# Altium integrated library 00Lib.IntLib: 286 symbols (part 1 of 2)
Pins are listed as number, name and electrical type; pins without a type are passive.

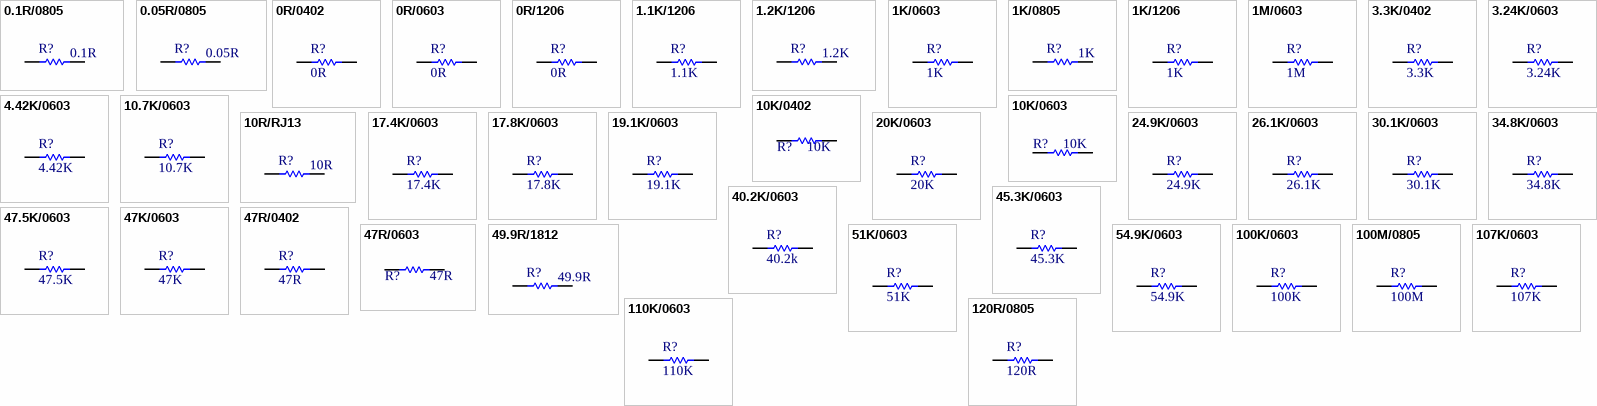
[diagram p0: symbols 0.1R/0805 to 120R/0805]

## 0.1R/0805
designator R?, comment 0.1R
阻值（欧姆） 0.1Ω / 精度 ±1% / 功率 1/3W / 温度系数 ±100ppm/°C; Manufacturer: UNI-ROYAL(厚声); A_Manufacturer: 718; Code: HP05W3F100LT5E; CompType: Resistor; A_ComType: RM型片式膜固定电阻器; DistributorCode: C270842; Package: 0805; A_Code: -
footprint S0805R
pins: 1, 2

## 0.05R/0805
designator R?, comment 0.05R
阻值（欧姆） 0.05Ω / 精度 ±1% / 功率 1/4W / 温度系数 ±400ppm/°C; Manufacturer: UNI-ROYAL(厚声); A_Manufacturer: 718; Code: CS05W4F500MT5E; CompType: Resistor; A_ComType: RM型片式膜固定电阻器; DistributorCode: C270863; Package: 0805; A_Code: -
footprint S0805R
pins: 1, 2

## 0R/0402
designator R?, comment 0R
精度 ±1% / 功率 1/16W C / 阻值 0Ω; Manufacturer: FH(风华); A_Manufacturer: 718; Code: RC-02000FT; A_Code: J-RM1005(0402)-K-B-0R-F; CompType: Resistor; A_ComType: RM型片式膜固定电阻器; DistributorCode: C140225; Package: 0402
footprint S0402R
pins: 1, 2

## 0R/0603
designator R?, comment 0R
精度 ±1% / 阻值 0Ω / 功率 0.1W; Manufacturer: FH(风华); A_Manufacturer: 718; Code: RS-03000FT; A_Code: J-RM1608(0603)-K-B-0R-F; CompType: Resistor; A_ComType: RM型片式膜固定电阻器; DistributorCode: C136582; Package: 0603
footprint S0603R (Footprint not found)
pins: 1, 2

## 0R/1206
designator R?, comment 0R
功率 0.25W / 精度 ±1% / 温度系数 ±100ppm/℃ / 阻值 1.1kΩ; Manufacturer: FH(风华); A_Manufacturer: 718; Code: RS-06000FT; A_Code: J-RM3216(1206)-K-B-0R-F; CompType: Resistor; A_ComType: RM型片式膜固定电阻器; DistributorCode: C140060; Package: 1206
footprint S0603R (Footprint not found)
footprint S1206R (1206 from SM-752 data)
pins: 1, 2

## 1.1K/1206
designator R?, comment 1.1K
功率 0.25W / 精度 ±1% / 温度系数 ±100ppm/℃ / 阻值 1.1kΩ; Manufacturer: FH(风华); A_Manufacturer: 718; Code: RS-06K1101FT; A_Code: J-RM3216(1206)-K-B-1.1K-F; CompType: Resistor; A_ComType: RM型片式膜固定电阻器; DistributorCode: C322820; Package: 1206
footprint S0603R (Footprint not found)
footprint S1206R (1206 from SM-752 data)
pins: 1, 2

## 1.2K/1206
designator R?, comment 1.2K
功率 0.25W / 精度 ±1% / 温度系数 ±100ppm/℃; Manufacturer: FH(风华); A_Manufacturer: 718; Code: RS-06K1201FT; A_Code: J-RM3216(1206)-K-B-1.2K-F; CompType: Resistor; A_ComType: RM型片式膜固定电阻器; DistributorCode: C88612; Package: 1206
footprint S0603R (Footprint not found)
footprint S1206R (1206 from SM-752 data)
pins: 1, 2

## 1K/0603
designator R?, comment 1K
精度 ±1% / 温度系数 ±100ppm/℃ / 阻值 1kΩ / 功率 0.1W; Manufacturer: FH(风华); A_Manufacturer: 718; Code: RS-03K1001FT; A_Code: J-RM1608(0603)-K-B-1K-F; CompType: Resistor; A_ComType: RM型片式膜固定电阻器; DistributorCode: C115325; Package: 0603
footprint S0603R
pins: 1, 2

## 1K/0805
designator R?, comment 1K
精度 ±1% / 温度系数 ±100ppm/℃ / 阻值 1kΩ / 功率 0.125W; Manufacturer: FH(风华); A_Manufacturer: 718; Code: RS-05K1001FT; A_Code: J-RM2012(0805)-K-B-1K-F; CompType: Resistor; A_ComType: RM型片式膜固定电阻器; DistributorCode: C115316; Package: 0805
footprint S0805R
pins: 1, 2

## 1K/1206
designator R?, comment 1K
功率 0.25W / 精度 ±1% / 温度系数 ±100ppm/℃ / 阻值 1kΩ; Manufacturer: FH(风华); A_Manufacturer: 718; Code: RS-06K1001FT; A_Code: J-RM3216(1206)-K-B-1K-F; CompType: Resistor; A_ComType: RM型片式膜固定电阻器; DistributorCode: C167634; Package: 1206
footprint S1206R (1206 from SM-752 data)
pins: 1, 2

## 1M/0603
designator R?, comment 1M
阻值 1MΩ / 精度 ±1% / 温度系数 ±100ppm/℃ / 功率 0.1W /; Manufacturer: FH(风华); A_Manufacturer: 718; Code: RS-03K1004FT; A_Code: J-RM1608(0603)-K-B-1M-F; CompType: Resistor; A_ComType: RM型片式膜固定电阻器; DistributorCode: C136593; Package: 0603
footprint S0603R
pins: 1, 2

## 3.3K/0402
designator R?, comment 3.3K
阻值 3.3kΩ / 精度 ±1% / 温度系数 ±200ppm/℃ / 功率 1/16W; Manufacturer: FH(风华); A_Manufacturer: 718; Code: RC-02W3301FT; A_Code: J-RM1005(0402)-K-B-3.3K-F; CompType: Resistor; A_ComType: RM型片式膜固定电阻器; DistributorCode: C310224; Package: 0402
footprint S0402R
pins: 1, 2

## 3.24K/0603
designator R?, comment 3.24K
精度 ±1% / 阻值 3.24kΩ / 温度系数 ±100ppm/℃ / 功率 0.1W; Manufacturer: FH(风华); A_Manufacturer: 718; Code: RS-03K3241FT; A_Code: J-RM1608(0603)-K-B-3.24K-F; CompType: Resistor; A_ComType: RM型片式膜固定电阻器; DistributorCode: C140102; Package: 0603
footprint S0603R
pins: 1, 2

## 4.42K/0603
designator R?, comment 4.42K
精度 ±1% / 阻值 4.42kΩ / 温度系数 ±100ppm/℃ / 功率 0.1W; Manufacturer: FH(风华); A_Manufacturer: 718; Code: RS-03K4421FT; A_Code: J-RM1608(0603)-K-B-4.42K-F; CompType: Resistor; A_ComType: RM型片式膜固定电阻器; DistributorCode: C321913; Package: 0603
footprint S0603R
pins: 1, 2

## 10.7K/0603
designator R?, comment 10.7K
精度 ±1% / 温度系数 ±100ppm/℃ / 阻值 10.7kΩ / 功率 0.1W; Manufacturer: FH(风华); A_Manufacturer: 718; Code: RS-03K1072FT; A_Code: J-RM1608(0603)-K-B-10.7K-F; CompType: Resistor; DistributorCode: C321678; Package: 0603
footprint S0603R (Footprint not found)
pins: 1, 2

## 10K/0402
designator R?, comment 10K
精度 ±1% / 温度系数 ±200ppm/℃ / 功率 1/16W / 阻值 10kΩ; Manufacturer: FH(风华); A_Manufacturer: 718; Code: RC-02W1002FT; A_Code: J-RM1005(0402)-K-B-10K-F; CompType: Resistor; A_ComType: RM型片式膜固定电阻器; DistributorCode: C258091; Package: 0402
footprint S0402R
pins: 1, 2

## 10K/0603
designator R?, comment 10K
精度 ±1% / 温度系数 ±100ppm/℃ / 阻值 10kΩ / 功率 0.1W; Manufacturer: FH(风华); A_Manufacturer: 718; Code: RS-03K1002FT; A_Code: J-RM1608(0603)-K-B-10K-F; CompType: Resistor; A_ComType: RM型片式膜固定电阻器; DistributorCode: C115324; Package: 0603
footprint S0603R
pins: 1, 2

## 10R/RJ13
designator R?, comment 10R
精度 ±1% / 温度系数 ±100ppm/℃ / 阻值 10Ω / 功率 0.167W; Manufacturer: 718; A_Code: J-RJ13-0.25W-10Ω-±1%-±100×10-6/K - SJ/T10775-2000; CompType: Resistor; A_ComType: RJ13型金属膜固定电阻器; Code: -; DistributorCode: -; Package: RJ13; A_Manufacturer: 718
footprint Axial-RJ13-1
pins: 1, 2

## 17.4K/0603
designator R?, comment 17.4K
精度 ±1% / 温度系数 ±100ppm/℃ / 阻值 17.4kΩ / 功率 0.1W; Manufacturer: FH(风华); A_Manufacturer: 718; Code: RS-03K1742FT; A_Code: J-RM1608(0603)-K-B-17.4K-F; CompType: Resistor; DistributorCode: C304711; Package: 0603
footprint S0603R (Footprint not found)
pins: 1, 2

## 17.8K/0603
designator R?, comment 17.8K
精度 ±1% / 温度系数 ±100ppm/℃ / 功率 0.1W; Manufacturer: FH(风华); A_Manufacturer: 718; Code: RS-03K1782FT; A_Code: J-RM1608(0603)-K-B-17.8K-F; CompType: Resistor; DistributorCode: C310271; Package: 0603
footprint S0603R (Footprint not found)
pins: 1, 2

## 19.1K/0603
designator R?, comment 19.1K
精度 ±1% / 阻值 19.1kΩ / 温度系数 ±100ppm/℃ / 功率 0.1W; Manufacturer: FH(风华); A_Manufacturer: 718; Code: RS-03K1912FT; A_Code: J-RM1608(0603)-K-B-19.1K-F; A_ComType: RM型片式膜固定电阻器; CompType: Resistor; DistributorCode: C321770; Package: 0603
footprint S0603R (Footprint not found)
pins: 1, 2

## 20K/0603
designator R?, comment 20K
精度 ±1% / 温度系数 ±100ppm/℃ / 阻值 20kΩ / 功率 0.1W; Manufacturer: FH(风华); A_Manufacturer: 718; Code: RS-03K2002FT; A_Code: J-RM1608(0603)-K-B-20K-F; CompType: Resistor; A_ComType: RM型片式膜固定电阻器; DistributorCode: C136589; Package: 0603
footprint S0603R (Footprint not found)
pins: 1, 2

## 24.9K/0603
designator R?, comment 24.9K
精度 ±1% / 温度系数 ±100ppm/℃ / 阻值 24.9kΩ / 功率 0.1W; Manufacturer: FH(风华); A_Manufacturer: 718; Code: RS-03K2492FT; A_Code: J-RM1608(0603)-K-B-24.9K-F; CompType: Resistor; DistributorCode: C321809; Package: 0603
footprint S0603R (Footprint not found)
pins: 1, 2

## 26.1K/0603
designator R?, comment 26.1K
精度 ±1% / 温度系数 ±100ppm/℃ / 功率 0.1W / 阻值 26.1kΩ; Manufacturer: FH(风华); A_Manufacturer: 718; Code: RS-03K2612FT; A_Code: J-RM1608(0603)-K-B-26.1K-F; CompType: Resistor; DistributorCode: C321818; Package: 0603
footprint S0603R (Footprint not found)
pins: 1, 2

## 30.1K/0603
designator R?, comment 30.1K
精度 ±1% / 温度系数 ±100ppm/℃ / 阻值 30.1kΩ / 功率 0.1W; Manufacturer: FH(风华); A_Manufacturer: 718; Code: RS-03K3012FT; A_Code: J-RM1608(0603)-K-B-30.1K-F; CompType: Resistor; A_ComType: RM型片式膜固定电阻器; DistributorCode: C321843; Package: 0603
footprint S0603R (Footprint not found)
pins: 1, 2

## 34.8K/0603
designator R?, comment 34.8K
精度 ±1% / 阻值 34.8kΩ / 温度系数 ±100ppm/℃ / 功率 0.1W; Manufacturer: FH(风华); A_Manufacturer: 718; Code: RS-03K3482FT; A_Code: J-RM1608(0603)-K-B-34.8K-F; CompType: Resistor; DistributorCode: C321868; Package: 0603
footprint S0603R (Footprint not found)
pins: 1, 2

## 40.2K/0603
designator R?, comment 40.2k
精度 ±1% / 阻值 40.2kΩ / 温度系数 ±100ppm/℃ / 功率 0.1W; Manufacturer: FH(风华); A_Manufacturer: 718; Code: RS-03K4022FT; A_Code: J-RM1608(0603)-K-B-40.2K-F; CompType: Resistor; A_ComType: RM型片式膜固定电阻器; DistributorCode: C286588; Package: 0603
footprint S0603R (Footprint not found)
pins: 1, 2

## 45.3K/0603
designator R?, comment 45.3K
精度 ±1% / 温度系数 ±100ppm/℃ / 功率 0.1W /; Manufacturer: FH(风华); A_Manufacturer: 718; Code: RS-03K4532FT; A_Code: J-RM1608(0603)-K-B-45.3K-F; CompType: Resistor; DistributorCode: C304756; Package: 0603
footprint S0603R (Footprint not found)
pins: 1, 2

## 47.5K/0603
designator R?, comment 47.5K
精度 ±1% / 阻值 47.5kΩ / 温度系数 ±100ppm/℃ / 功率 0.1W; Manufacturer: FH(风华); A_Manufacturer: 718; Code: RS-03K4752FT; A_Code: J-RM1608(0603)-K-B-47.5K-F; CompType: Resistor; A_ComType: RM型片式膜固定电阻器; DistributorCode: C321924; Package: 0603
footprint S0603R (Footprint not found)
pins: 1, 2

## 47K/0603
designator R?, comment 47K
阻值 47kΩ / 精度 ±1% / 温度系数 ±100ppm/℃ / 功率 0.1W /; Manufacturer: FH(风华); A_Manufacturer: 718; Code: RS-03K4702FT; A_Code: J-RM1608(0603)-K-B-47K-F; CompType: Resistor; A_ComType: RM型片式膜固定电阻器; DistributorCode: C136590; Package: 0603
footprint S0603R (Footprint not found)
pins: 1, 2

## 47R/0402
designator R?, comment 47R
功率 1/16W / 精度 ±1% / 温度系数 ±200ppm/℃ / 阻值 47Ω; Manufacturer: FH(风华); A_Manufacturer: 718; Code: RC-02W47R0FT; A_Code: J-RM1005(0402)-K-B-47R-F; CompType: Resistor; A_ComType: RM型片式膜固定电阻器; DistributorCode: C304619; Package: 0402
footprint S0402R1
pins: 1, 2

## 47R/0603
designator R?, comment 47R
精度 ±1% / 温度系数 ±100ppm/℃ / 阻值 47Ω / 功率 0.1W; Manufacturer: FH(风华); A_Manufacturer: 718; Code: RS-03K47R0FT; A_Code: J-RM1608(0603)-K-B-47R-F; CompType: Resistor; A_ComType: RM型片式膜固定电阻器; DistributorCode: C140087; Package: 0603
footprint S0603R (Footprint not found)
pins: 1, 2

## 49.9R/1812
designator R?, comment 49.9R
精度 ±1% / 功率 0.75W / 温度系数 ±100ppm/℃ / 阻值 49.9Ω; Manufacturer: UNI-ROYAL(厚声); A_Manufacturer: 718; Code: 181207F499JT4E; CompType: Resistor; A_ComType: RM型片式膜固定电阻器; DistributorCode: C422079; Package: 0805; A_Code: -
footprint R1812 (Chip Resistor, Body 180x120mil (4.5x3.2mm))
pins: 1, 2

## 51K/0603
designator R?, comment 51K
阻值 51kΩ / 精度 ±1% / 温度系数 ±100ppm/℃ / 功率 0.1W; Manufacturer: FH(风华); A_Manufacturer: 718; Code: RS-03K5102FT; A_Code: J-RM1608(0603)-K-B-51K-F; CompType: Resistor; A_ComType: RM型片式膜固定电阻器; DistributorCode: C95329; Package: 0603
footprint S0603R
pins: 1, 2

## 54.9K/0603
designator R?, comment 54.9K
精度 ±1% / 温度系数 ±100ppm/℃ / 功率 0.1W; Manufacturer: FH(风华); A_Manufacturer: 718; Code: RS-03K5492FT; A_Code: J-RM1608(0603)-K-B-54.9K-F; CompType: Resistor; A_ComType: RM型片式膜固定电阻器; DistributorCode: C321944; Package: 0603
footprint S0603R
pins: 1, 2

## 100K/0603
designator R?, comment 100K
精度 ±1% / 阻值 100kΩ / 温度系数 ±100ppm/℃ / 功率 0.1W; Manufacturer: FH(风华); A_Manufacturer: 718; Code: RS-03K1003FT; A_Code: J-RM1608(0603)-K-B-100K-F; CompType: Resistor; A_ComType: RM型片式膜固定电阻器; DistributorCode: C115320; Package: 0603
footprint S0603R
pins: 1, 2

## 100M/0805
designator R?, comment 100M
精度 ±1% / 温度系数 ±100ppm/℃ / 功率 0.125W; Manufacturer: UNI-ROYAL(厚声); A_Manufacturer: 718; Code: 0805W8F1006T5E; A_Code: J-RM2012(0805)-K-B-100M-F; CompType: Resistor; DistributorCode: C169373; Package: 0805
footprint S0805R
pins: 1, 2

## 107K/0603
designator R?, comment 107K
精度 ±1% / 温度系数 ±100ppm/℃ / 功率 0.1W; Manufacturer: FH(风华); A_Manufacturer: 718; Code: RS-03K1073FT; A_Code: J-RM1608(0603)-K-B-107K-F; CompType: Resistor; A_ComType: RM型片式膜固定电阻器; DistributorCode: C321679; Package: 0603
footprint S0603R (Footprint not found)
pins: 1, 2

## 110K/0603
designator R?, comment 110K
精度 ±1% / 温度系数 ±100ppm/℃ / 功率 0.1W / 阻值 110kΩ; Manufacturer: FH(风华); A_Manufacturer: 718; Code: RS-03K1103FT; A_Code: J-RM1608(0603)-K-B-110K-F; CompType: Resistor; A_ComType: RM型片式膜固定电阻器; DistributorCode: C304689; Package: 0603
footprint S0603R (Footprint not found)
pins: 1, 2

## 120R/0805
designator R?, comment 120R
精度 ±1% / 温度系数 ±100ppm/℃ / 阻值 120Ω / 功率 0.125W; Manufacturer: FH(风华); A_Manufacturer: 718; Code: RS-05K1200FT; A_Code: J-RM2012(0805)-K-B-120R-F; CompType: Resistor; A_ComType: RM型片式膜固定电阻器; DistributorCode: C139926; Package: 0805
footprint S0805R
pins: 1, 2

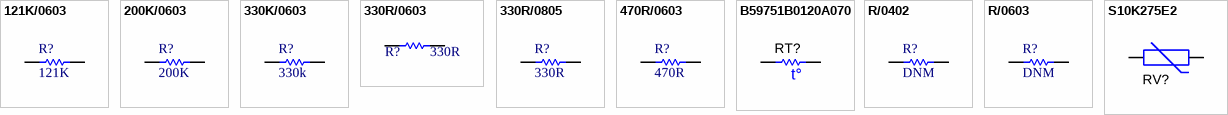
[diagram p1: symbols 121K/0603 to S10K275E2]

## 121K/0603
designator R?, comment 121K
精度 ±1% / 阻值 121kΩ / 温度系数 ±100ppm/℃ / 功率 0.1W; Manufacturer: FH(风华); A_Manufacturer: 718; Code: RS-03K1213FT; A_Code: J-RM1608(0603)-K-B-121K-F; CompType: Resistor; DistributorCode: C321700; Package: 0603
footprint S0603R (Footprint not found)
pins: 1, 2

## 200K/0603
designator R?, comment 200K
精度 ±1% / 温度系数 ±100ppm/℃ / 功率 0.1W / 阻值 200kΩ; Manufacturer: FH(风华); A_Manufacturer: 718; Code: RS-03K2003FT; A_Code: J-RM1608(0603)-K-B-200K-F; CompType: Resistor; DistributorCode: C95331; Package: 0603
footprint S0603R (Footprint not found)
pins: 1, 2

## 330K/0603
designator R?, comment 330k
精度 ±1% / 温度系数 ±100ppm/℃ / 功率 0.1W; Manufacturer: FH(风华); A_Manufacturer: 718; Code: RS-03K3303FT; A_Code: J-RM1608(0603)-K-B-330K-F; CompType: Resistor; DistributorCode: C286584; Package: 0603
footprint S0603R (Footprint not found)
pins: 1, 2

## 330R/0603
designator R?, comment 330R
精度 ±1% / 温度系数 ±100ppm/℃ / 阻值 330Ω / 功率 0.1W; Manufacturer: FH(风华); A_Manufacturer: 718; Code: RS-03K3300FT; A_Code: J-RM1608(0603)-K-B-330R-F; CompType: Resistor; A_ComType: RM型片式膜固定电阻器; DistributorCode: C125768; Package: 0603
footprint S0603R (Footprint not found)
pins: 1, 2

## 330R/0805
designator R?, comment 330R
精度 ±1% / 温度系数 ±100ppm/℃ / 功率 0.125W; Manufacturer: FH(风华); A_Manufacturer: 718; A_Code: J-RM2012(0805)-K-B-330R-F; CompType: Resistor; A_ComType: RM型片式膜固定电阻器; Code: RS-05K3300FT; DistributorCode: C154442; Package: 0805
footprint S0805R
pins: 1, 2

## 470R/0603
designator R?, comment 470R
精度 ±1% / 温度系数 ±100ppm/℃ / 功率 0.1W; Manufacturer: FH(风华); A_Manufacturer: 718; Code: RS-03K4700FT; A_Code: J-RM1608(0603)-K-B-470R-F; CompType: Resistor; A_ComType: RM型片式膜固定电阻器; DistributorCode: C116694; Package: 0603
footprint S0603R (Footprint not found)
pins: 1, 2

## B59751B0120A070
designator RT?, comment B59751C0120A070  (value not drawn)
Thermistor NTC, 50 ohm, 25%, D13xH18mm; Manufacturer: TDK; Value: 50; Tolerance_%: 25; TaMin_C: -40; TaMax_C: 125; U/M: EA; CompType: ThermistorNTC; SymbolVersion: 2008-11-25; PartNumber: B59751C0120A070; Series: B597; PackageReference: D13xH18mm; MountType: TH; RoHS: Y; ComponentLink1Description: Datasheet link; ComponentLink1URL: https://www.tdk-electronics.tdk.com/inf/55/db/PTC/PTC_ICL_OC_Leaded_260V_1000V.pdf; Published: 2009-09-22; Publisher: Texas Instruments; LatestRevisionDate: 2015-09-01; Supplier 1: Digi-Key; Supplier Part Number 1: 495-7219-ND; Supplier 2: Mouser; Supplier Part Number 2: 871-B59751C0120A070; Supplier 3: Farnell; Supplier Part Number 3: 2112820
footprint TDK_B751
pins: 1, 2
text: t°

## R/0402
designator R?, comment DNM
Manufacturer: FH(风华); A_Manufacturer: 718; CompType: Resistor; A_ComType: RM型片式膜固定电阻器; Code: -; DistributorCode: -; Package: 0402; A_Code: -
footprint S0402R
pins: 1, 2

## R/0603
designator R?, comment DNM
Manufacturer: FH(风华); A_Manufacturer: 718; CompType: Resistor; A_ComType: RM型片式膜固定电阻器; Code: -; DistributorCode: -; Package: 0603; A_Code: -
footprint S0603R
pins: 1, 2

## S10K275E2
designator RV?  (value not drawn)
Varistor 275V RMS 10MM Radial, TH; Manufacturer: EPCOS Inc; SymbolCreator: a0412235; SymbolVersion: 2012-06-04; PartNumber: S10K275E2; MountType: TH; ComponentLink1Description: Datasheet URL; ComponentLink1URL: http://www.epcos.com/inf/70/db/var_08/SIOV_Leaded_AdvanceD.pdf; RoHS: Y; PackageReference: 10mm Radial; Publisher: Texas Instruments; LatestRevisionDate: 2013-02-24; Supplier 1: Digi-Key; Supplier Part Number 1: 495-1433-ND
footprint VAR_S10K275E2
pins: 1, 2


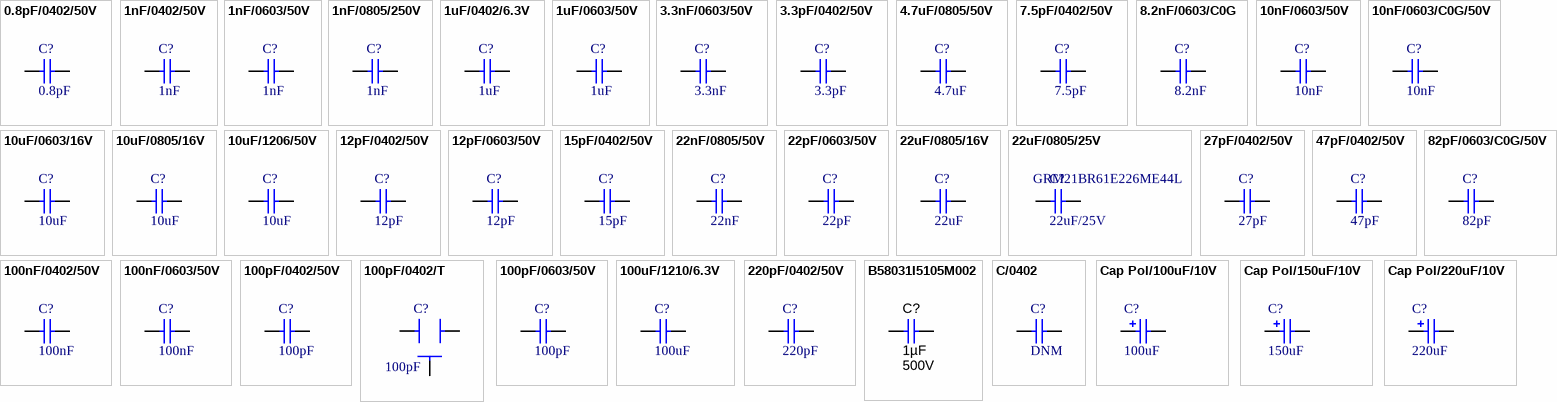
[diagram p2: symbols 0.8pF/0402/50V to Cap Pol/220uF/10V]

## 0.8pF/0402/50V
designator C?, comment 0.8pF
精度 ±0.1pF / 容值 0.8pF / 额定电压 50V / 温漂系数（介质材料) C0G; Manufacturer: FH(风华); A_Manufacturer: 元六; Code: 0402CG0R8B500NT; A_Code: J CC41Q-0402-BC-50V-0R8-B; CompType: Capacitor; A_ComType: 一类电容; DistributorCode: C285068; Package: 0402
footprint S0402C
pins: 1, 2

## 1nF/0402/50V
designator C?, comment 1nF
精度 ±5% / 容值 1nF / 额定电压 50V / 温漂系数（介质材料) C0G; Manufacturer: FH(风华); A_Manufacturer: 元六; Code: 0402CG102J500NT; A_Code: J CC41-0402-CG-50V-102J; CompType: Capacitor; A_ComType: 一类电容; DistributorCode: C53547; Package: 0402
footprint S0402C
pins: 1, 2

## 1nF/0603/50V
designator C?, comment 1nF
精度 ±5% / 容值 1nF / 额定电压 50V / 温漂系数（介质材料) C0G; Manufacturer: FH(风华); A_Manufacturer: 元六; Code: 0603CG102J500NT; A_Code: J CC41-0603-CG-50V-102J; CompType: Capacitor; DistributorCode: C1636; Package: 0603
footprint S0603C
pins: 1, 2

## 1nF/0805/250V
designator C?, comment 1nF
精度 ±10% / 容值 1nF / 额定电压 250V / 温漂系数（介质材料) X7R; Manufacturer: FH(风华); A_Manufacturer: 元六; Code: 0805B102K251NT; CompType: Capacitor; A_ComType: 二类电容; Package: 0805; DistributorCode: C285058
footprint S0603C
simulation model CAP (Capacitor)
signal-integrity model Cap
footprint S0805C
pins: 1, 2

## 1uF/0402/6.3V
designator C?, comment 1uF
精度 ±10% / 容值 1uF / 额定电压 6.3V / 温漂系数（介质材料) X5R /; Manufacturer: FH(风华); A_Manufacturer: 元六; Code: 0402X105K6R3NT; A_Code: J CT41-0402-2R2-6V3-105M; CompType: Capacitor; A_ComType: 二类电容; DistributorCode: C142376; Package: 0402
footprint S0402C
pins: 1, 2

## 1uF/0603/50V
designator C?, comment 1uF
精度 ±10% / 容值 1uF / 额定电压 50V / 温漂系数（介质材料) X7R; Manufacturer: FH(风华); A_Manufacturer: 元六; Code: 0603B105K500NT; A_Code: J CT41-0603-2R1-50V-105M; CompType: Capacitor; A_ComType: 二类电容; DistributorCode: C90540; Package: 0603
footprint S0402C
footprint S0603C
pins: 1, 2

## 3.3nF/0603/50V
designator C?, comment 3.3nF
精度 ±5% / 容值 3.3nF / 额定电压 50V / 温漂系数（介质材料) C0G; Manufacturer: FH(风华); A_Manufacturer: 元六; Code: 0603CG332J500NT; A_Code: J CC41-0603-CG-50V-332J; CompType: Capacitor; DistributorCode: C190576; Package: 0603
footprint S0603C
pins: 1, 2

## 3.3pF/0402/50V
designator C?, comment 3.3pF
精度 ±0.1pF / 容值 3.3pF / 额定电压 50V / 温漂系数（介质材料) C0G; Manufacturer: FH(风华); A_Manufacturer: 元六; Code: 0402CG3R3B500NT; A_Code: J CC41-0402-CG-50V-3R3C; CompType: Capacitor; A_ComType: 一类电容; DistributorCode: C285083; Package: 0402
footprint S0402C
pins: 1, 2

## 4.7uF/0805/50V
designator C?, comment 4.7uF
精度 ±20% / 容值 4.7uF / 额定电压 50V / 温漂系数（介质材料) Y5V /; Manufacturer: FH(风华); A_Manufacturer: 元六; Code: 0805F475M500NT; CompType: Capacitor; A_Code: J CT41-0805-2R2-50V-475M; A_ComType: 二类电容; Package: 0805; DistributorCode: C215908
footprint S0805C
simulation model CAP (Capacitor)
signal-integrity model Cap
pins: 1, 2

## 7.5pF/0402/50V
designator C?, comment 7.5pF
精度 ±0.25pF / 容值 7.5pF / 额定电压 50V / 温漂系数（介质材料) C0G; Manufacturer: FH(风华); A_Manufacturer: 元六; Code: 0402CG7R5C500NT; A_Code: J CC41Q-0402-BC-50V-7R5-C; CompType: Capacitor; A_ComType: 一类电容; DistributorCode: C43514; Package: 0402
footprint S0402C
pins: 1, 2

## 8.2nF/0603/C0G
designator C?, comment 8.2nF
精度 ±5% / 容值 8.2nF / 额定电压 50V / 温漂系数（介质材料) C0G; Manufacturer: TDK; A_Manufacturer: 元六; Code: C1608C0G1H822JT000N; A_Code: J CC41-0603-CG-50V-822J; CompType: Capacitor; DistributorCode: C445716; Package: 0603
footprint S0603C
pins: 1, 2

## 10nF/0603/50V
designator C?, comment 10nF
精度 ±10% / 容值 10nF / 额定电压 50V / 温漂系数（介质材料) X7R; Manufacturer: FH(风华); A_Manufacturer: 元六; Code: 0603B103K500NT; A_Code: J CT41-0603-2R1-50V-103K; CompType: Capacitor; A_ComType: 二类电容; Package: 0603; DistributorCode: C57112
footprint S0603C
pins: 1, 2

## 10nF/0603/C0G/50V
designator C?, comment 10nF
精度 ±5% / 容值 10nF / 额定电压 50V / 温漂系数（介质材料) C0G; Manufacturer: FH(风华); A_Manufacturer: 元六; Code: 0603CG103J500NT; A_Code: J CC41-0603-CG-50V-103J; CompType: Capacitor; DistributorCode: C82282; Package: 0603
footprint S0603C
pins: 1, 2

## 10uF/0603/16V
designator C?, comment 10uF
精度 ±10% / 容值 10uF / 额定电压 16V / 温漂系数（介质材料) X5R; Manufacturer: FH(风华); A_Manufacturer: 元六; Code: 0603X106K160NT; CompType: Capacitor; A_Code: J CT41-0603-2R2-16V-106M; A_ComType: 二类电容; Package: 0603; DistributorCode: C70225
footprint S0603C
simulation model CAP (Capacitor)
signal-integrity model Cap
pins: 1, 2

## 10uF/0805/16V
designator C?, comment 10uF
精度 ±10% / 容值 10uF / 额定电压 16V / 温漂系数（介质材料) X7R; Manufacturer: FH(风华); A_Manufacturer: 元六; Code: 0805B106K160NT; CompType: Capacitor; A_Code: J CT41-0805-2R2-16V-106M; A_ComType: 二类电容; Package: 0805; DistributorCode: C92341
footprint S0603C
simulation model CAP (Capacitor)
signal-integrity model Cap
footprint S0805C
pins: 1, 2

## 10uF/1206/50V
designator C?, comment 10uF
精度 ±10% / 容值 10uF / 额定电压 50V / 温漂系数（介质材料) X5R; Manufacturer: SAMSUNG(三星); A_Manufacturer: 元六; Code: CL31A106KBHNNNE; CompType: Capacitor; A_ComType: 二类电容; Package: 1206; DistributorCode: C13585; A_Code: -
footprint S0603C
simulation model CAP (Capacitor)
signal-integrity model Cap
pins: 1, 2

## 12pF/0402/50V
designator C?, comment 12pF
精度 ±1% / 容值 12pF / 额定电压 50V / 温漂系数（介质材料) C0G; Manufacturer: FH(风华); A_Manufacturer: 元六; Code: 0402CG120F500NT; A_Code: J CC41-0402-CG-50V-120J; CompType: Capacitor; A_ComType: 一类电容; DistributorCode: C182477; Package: 0402
footprint S0402C
pins: 1, 2

## 12pF/0603/50V
designator C?, comment 12pF
精度 ±5% / 容值 12pF / 额定电压 50V / 温漂系数（介质材料) C0G; Manufacturer: FH(风华); A_Manufacturer: 元六; Code: 0603CG120J500NT; A_Code: J CC41-0603-CG-50V-120J; CompType: Capacitor; A_ComType: 一类电容; DistributorCode: C1642; Package: 0603
footprint S0603C
pins: 1, 2

## 15pF/0402/50V
designator C?, comment 15pF
精度 ±1% / 容值 15pF / 额定电压 50V / 温漂系数（介质材料) C0G; Manufacturer: FH(风华); A_Manufacturer: 元六; Code: 0402CG150F500NT; A_Code: J CC41-0402-CG-50V-150J; CompType: Capacitor; A_ComType: 一类电容; DistributorCode: C285151; Package: 0402
footprint S0402C
pins: 1, 2

## 22nF/0805/50V
designator C?, comment 22nF
精度 ±5% / 容值 22nF / 额定电压 50V / 温漂系数（介质材料) C0G; Manufacturer: TDK; A_Manufacturer: 元六; Code: C2012C0G1H223JT000N; CompType: Capacitor; A_Code: J CC41-0805-CG-50V-223J; A_ComType: 一类电容; Package: 0805; DistributorCode: C342593
footprint S0603C
simulation model CAP (Capacitor)
signal-integrity model Cap
footprint S0805C
pins: 1, 2

## 22pF/0603/50V
designator C?, comment 22pF
精度 ±5% / 容值 22pF / 额定电压 50V / 温漂系数（介质材料) C0G; Manufacturer: FH(风华); A_Manufacturer: 元六; Code: 0603CG220J500NT; A_Code: J CC41-0603-CG-50V-220J; CompType: Capacitor; A_ComType: 一类电容; DistributorCode: C91701; Package: 0603
footprint S0603C
pins: 1, 2

## 22uF/0805/16V
designator C?, comment 22uF
精度 ±20% / 容值 22uF / 额定电压 16V / 温漂系数（介质材料) X5R; Manufacturer: FH(风华); A_Manufacturer: 元六; Code: 0805X226M160NT; A_Code: J CT41-0805-2R2-16V-226M; CompType: Capacitor; A_ComType: 二类电容; DistributorCode: C129302; Package: 0805
footprint S0805C
pins: 1, 2

## 22uF/0805/25V
designator C?, comment 22uF/25V  Code: GRM21BR61E226ME44L
精度 ±20% / 容值 22uF / 额定电压 25V / 温漂系数（介质材料) X5R; Manufacturer: muRata(村田); A_Manufacturer: 元六; A_Code: J CT41-0805-2R2-25V-226M; CompType: Capacitor; A_ComType: 二类电容; DistributorCode: C86816; Package: 0805
footprint S0805C
pins: 1, 2

## 27pF/0402/50V
designator C?, comment 27pF
精度 ±2% / 容值 27pF / 额定电压 50V / 温漂系数（介质材料) C0G; Manufacturer: FH(风华); A_Manufacturer: 元六; Code: 0402CG270G500NT; A_Code: J CC41-0402-CG-50V-270J; CompType: Capacitor; A_ComType: 一类电容; DistributorCode: C501824; Package: 0402
footprint S0402C
pins: 1, 2

## 47pF/0402/50V
designator C?, comment 47pF
精度 ±2% / 容值 47pF / 额定电压 50V / 温漂系数（介质材料) C0G; Manufacturer: FH(风华); A_Manufacturer: 元六; Code: 0402CG470G500NT; A_Code: J CC41-0402-CG-50V-470J; CompType: Capacitor; A_ComType: 一类电容; DistributorCode: C285090; Package: 0402
footprint S0402C
pins: 1, 2

## 82pF/0603/C0G/50V
designator C?, comment 82pF
精度 ±5% / 容值 82pF / 额定电压 50V / 温漂系数（介质材料) C0G; Manufacturer: FH(风华); A_Manufacturer: 元六; Code: 0603CG820J500NT; A_Code: J CC41-0603-CG-50V-820J; CompType: Capacitor; DistributorCode: C1683; Package: 0603
footprint S0603C
pins: 1, 2

## 100nF/0402/50V
designator C?, comment 100nF
精度 ±10% / 容值 100nF / 额定电压 50V / 温漂系数（介质材料) X7R; Manufacturer: FH(风华); A_Manufacturer: 元六; Code: 0402B104K500NT; A_Code: J CT41-0402-2R1-50V-104M; CompType: Capacitor; A_ComType: 二类电容; DistributorCode: C110251; Package: 0402
footprint S0402C
pins: 1, 2

## 100nF/0603/50V
designator C?, comment 100nF
精度 ±10% / 容值 100nF / 额定电压 50V / 温漂系数（介质材料) X7R; Manufacturer: FH(风华); A_Manufacturer: 元六; Code: 0603B104K500NT; A_Code: J CT41-0603-2R1-50V-104K; CompType: Capacitor; A_ComType: 二类电容; DistributorCode: C30926; Package: 0603
footprint S0603C
pins: 1, 2

## 100pF/0402/50V
designator C?, comment 100pF
精度 ±5% / 容值 100pF / 额定电压 50V / 温漂系数（介质材料) C0G; Manufacturer: FH(风华); A_Manufacturer: 元六; Code: 0402CG101J500NT; A_Code: J CC41-0402-CG-50V-101J; CompType: Capacitor; A_ComType: 一类电容; DistributorCode: C1546; Package: 0402
footprint S0402C
pins: 1, 2

## 100pF/0402/T
designator C?, comment 100pF
精度 ±5% / 容值 100pF / 额定电压 50V / 温漂系数（介质材料) C0G; Manufacturer: FH(风华); A_Manufacturer: 元六; Code: 0402CG101J500NT; A_Code: J CC41-0402-CG-50V-101J; A_ComType: 一类电容; CompType: Capacitor; DistributorCode: C1546; Package: 0402
footprint ST0402C
pins: 1, 2, 3

## 100pF/0603/50V
designator C?, comment 100pF
精度 ±5% / 容值 100pF / 额定电压 50V / 温漂系数（介质材料) C0G; Manufacturer: FH(风华); A_Manufacturer: 元六; Code: 0603CG101J500NT; A_Code: J CC41-0603-CG-50V-101J; CompType: Capacitor; A_ComType: 一类电容; DistributorCode: C1635; Package: 0603
footprint S0603C
pins: 1, 2

## 100uF/1210/6.3V
designator C?, comment 100uF
精度 ±20% / 容值 100uF / 额定电压 6.3V / 温漂系数（介质材料) X5R; Manufacturer: muRata(村田); A_Manufacturer: 元六; Code: GRM32ER60J107ME20L; A_Code: J CT41-1210-2R2-10V-107M; CompType: Capacitor; DistributorCode: C88154; Package: 1210
footprint S1210C (Footprint not found)
pins: 1, 2

## 220pF/0402/50V
designator C?, comment 220pF
精度 ±5% / 容值 220pF / 额定电压 50V / 温漂系数（介质材料) C0G; Manufacturer: FH(风华); A_Manufacturer: 元六; Code: 0402CG221J500NT; A_Code: J CC41-0402-CG-50V-221J; CompType: Capacitor; A_ComType: 一类电容; DistributorCode: C39122; Package: 0402
footprint S0402C1
pins: 1, 2

## B58031I5105M002
designator C?, comment ValueDisplayed: 1µF  Value2: 500V  (hidden comment: B58031I5105M062)
CAP, CERM, 1 µF, 500 V, +/- 20%, B58031, AEC-Q200 Grade 0, 6.84x7.85mm; Manufacturer: TDK; Polarized: N; CompType: Capacitor; Value: 1uF; U/M: EA; Cap_F: 0.000001; Tolerance_%: 20; Value1: Unknown; VDC_V: 500; IRMS_A: 7.5; TaMin_C: -40; TaMax_C: 150; Cap_Case: 10.84x7.85x4.5mm; SizeArea_mm2: 85.094; SizeAreaWB_mm2: 126.474; SizeX_mm: 10.84; SizeY_mm: 7.85; SizeZ_mm: 4.5; AEC Category: Q200; AEC Qualified: Y; AEC Grade: 0; SymbolVersion: 2008-07-09; PartNumber: B58031I5105M062; PackageReference: 6.84x7.85mm; RoHS: E; MountType: SMT; Technology: Ceramic; TempCo: B58031; Published: 2008-06-19; Publisher: Texas Instruments; LatestRevisionDate: 2017-01-04; ComponentLink1Description: Datasheet link; ComponentLink1URL: https://en.tdk.eu/inf/20/10/ds/B58031_LP.pdf; Supplier 1: Digi-Key; Supplier Part Number 1: 495-6707-ND; Supplier 2: Mouser; Supplier Part Number 2: 871-B58031I5105M062; Supplier 3: Farnell; Supplier Part Number 3: 2470604
signal-integrity model Cap
simulation model Cap
footprint B58031I_1084x785x450
pins: 1, 2

## C/0402
designator C?, comment DNM
Manufacturer: FH(风华); A_Manufacturer: 元六; CompType: Capacitor; Code: -; DistributorCode: -; Package: 0402; A_Code: -; A_ComType: -
footprint S0402C
pins: 1, 2

## Cap Pol/100uF/10V
designator C?, comment 100uF
钽电容 / 精度 ±10% / 容值 100uF / 额定电压 10V / ESR串联电阻 - / 工作温度 -55℃ ~ +125℃; Manufacturer: AVX; Code: TAJD107K010RNJV; CompType: Cap Pol; A_Code: 请补充; DistributorCode: C282489; Package: CASE-D_7343; A_ComType: 请补充; A_Manufacturer: 请补充
footprint CAPMP7343X430A2N
simulation model CAP (Capacitor)
signal-integrity model Cap Pol
pins: 1, 2
1 alternate drawing of the same symbol

## Cap Pol/150uF/10V
designator C?, comment 150uF
钽电容 / 精度 ±10% / 容值 150uF / 额定电压 10V / ESR串联电阻 900 mΩ @ 100kHz / 工作温度 -55℃ ~ +125℃; Manufacturer: AVX; Code: TAJD157K010RNJ; CompType: Cap Pol; A_Code: 请补充; DistributorCode: C127980; Package: CASE-D_7343; A_ComType: 请补充; A_Manufacturer: 请补充
footprint CAPMP7343X430A2N
simulation model CAP (Capacitor)
signal-integrity model Cap Pol
pins: 1, 2
1 alternate drawing of the same symbol

## Cap Pol/220uF/10V
designator C?, comment 220uF
电容：220μF / 容差：±10% / 电压 - 额定：10V / ESR（等效串联电阻）：500 毫欧 / 类型：模制 / 工作温度：-55°C ~ 125°C / 安装类型：表面贴装 / 封装/外壳：2917（7343 公制） / 大小/尺寸：0.287" 长 x 0.169" 宽（7.30mm x 4.30mm） / 高度 - 安装（最大值）：0.122"（3.10mm） / 制造商尺寸代码：D / 特性：通用; Manufacturer: AVX; Code: TAJD227K010RNJ; CompType: Cap Pol; A_Code: 请补充; DistributorCode: C8024; Package: CASE-D_7343; A_ComType: 请补充; A_Manufacturer: 请补充
footprint CAPMP7343X430A2N
simulation model CAP (Capacitor)
signal-integrity model Cap Pol
pins: 1, 2
1 alternate drawing of the same symbol


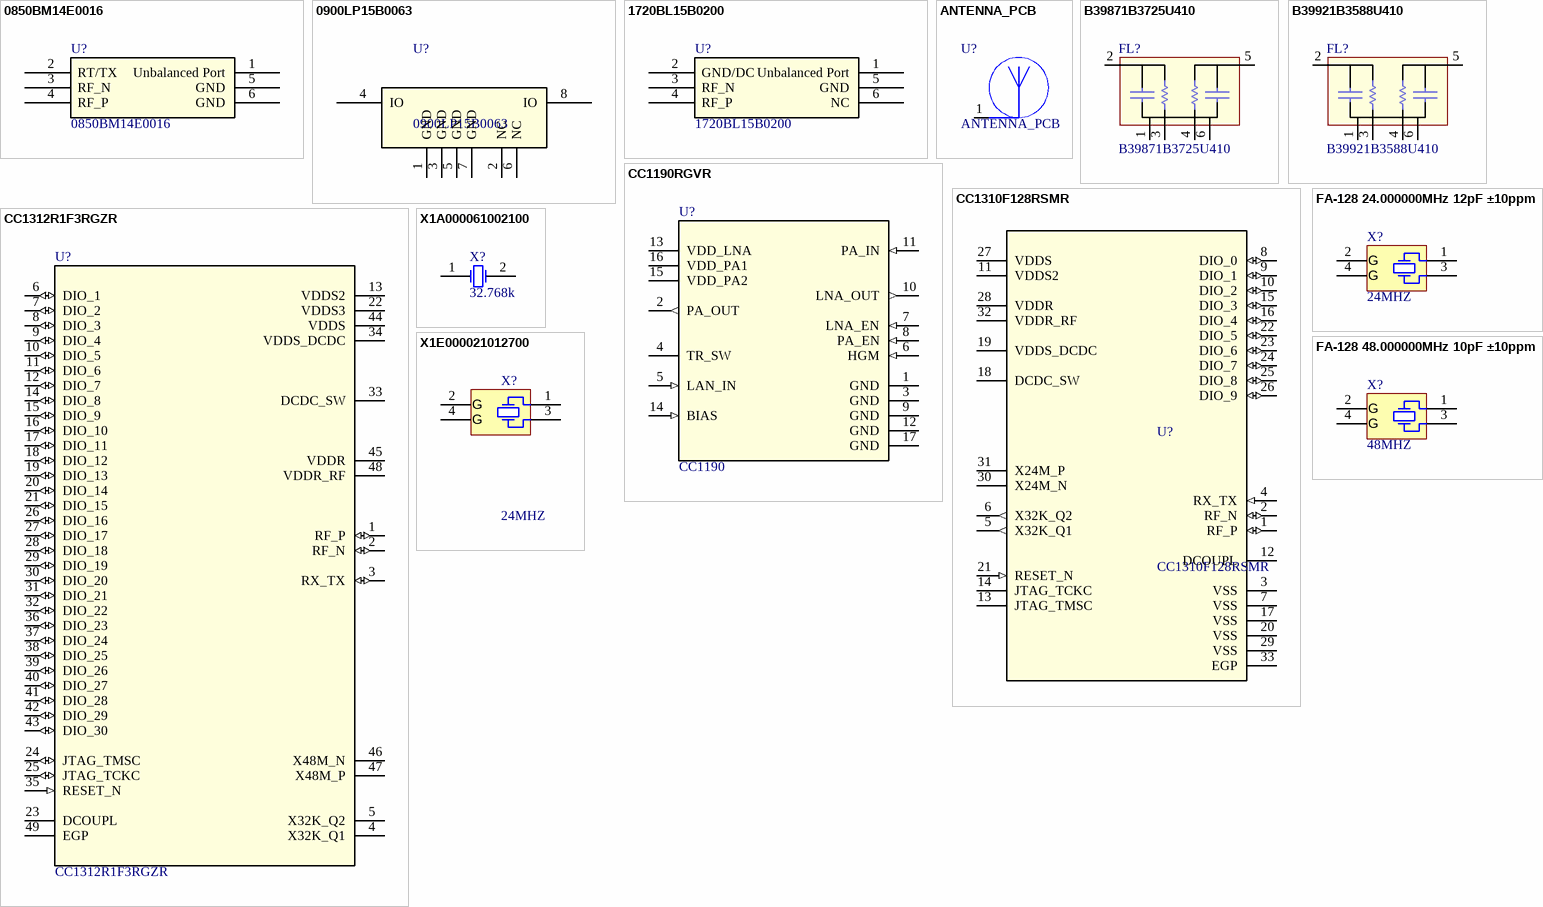
[diagram p3: symbols 0850BM14E0016 to X1E000021012700]

## 0850BM14E0016
designator U?
770 - 860 860 - 928MHz / -40°C to +85°C / Pmax 2W; Manufacturer: Johanson Technology; CompType: Balun; Code: 0850BM14E0016; DistributorCode: -; Package: 6P0603; A_Code: -; A_ComType: -; A_Manufacturer: -
footprint 6P0603
pins: 1 Unbalanced Port, 2 RT/TX, 3 RF_N, 4 RF_P, 5 GND, 6 GND

## 0900LP15B0063
designator U?
863 - 960MHz / -40 to +85°C / 3Fo Attenuation (2589-2784MHz) 50dB / 2Fo Attenuation (1726-1856MHz) 59dB /; Manufacturer: Johanson Technology; CompType: 低通; Code: 0900LP15B0063; DistributorCode: *; Package: 8P0805
footprint 8P0805 (Footprint not found)
pins: 1 GND, 2 NC, 3 GND, 4 IO, 5 GND, 6 NC, 7 GND, 8 IO

## 1720BL15B0200
designator U?
滤波器; Manufacturer: Johanson Technology; CompType: Balun; Code: 1720BL15B0200; DistributorCode: *; Package: 6P0805
footprint 6P0603
pins: 1 Unbalanced Port, 2 GND/DC, 3 RF_N, 4 RF_P, 5 GND, 6 NC

## ANTENNA_PCB
designator U?
Manufacturer: -; Code: -; DistributorCode: -; Package: P1X1
footprint P1X1
pins: 1

## B39871B3725U410
designator FL?
868.00 ... 870.00 MHz; Manufacturer: RF360; CompType: SWA filter; DistributorCode: Mouser 零件编号：871-B39871B3715U410; Code: B39871B3725U410; Package: DCC6C; A_Code: -; A_ComType: -; A_Manufacturer: -
footprint FIL_DCC6CN
pins: 1, 2, 3, 4, 5, 6

## B39921B3588U410
designator FL?
902.00 ... 928.00 MHz; Manufacturer: RF360; CompType: SWA filter; DistributorCode: Mouser 零件编号：871-B39921B3588U410; Code: B39921B3588U410; Package: DCC6C; A_Code: -; A_ComType: -; A_Manufacturer: -
footprint FIL_DCC6CN
pins: 1, 2, 3, 4, 5, 6
